# Altium footprint library Molex FFC - FPC Connectors (SMT).PcbLib: 638 footprints (part 14 of 40)
Each footprint in its own frame and in the unit in brackets; x right, y up, seen from the top. Pads: shape width x height; smd on the part's side, far side on the other; paste and mask are expansions set on the pad; w line width, h text height; cw(c..) or ccw(c..) is an arc to the next point about the centre after c.
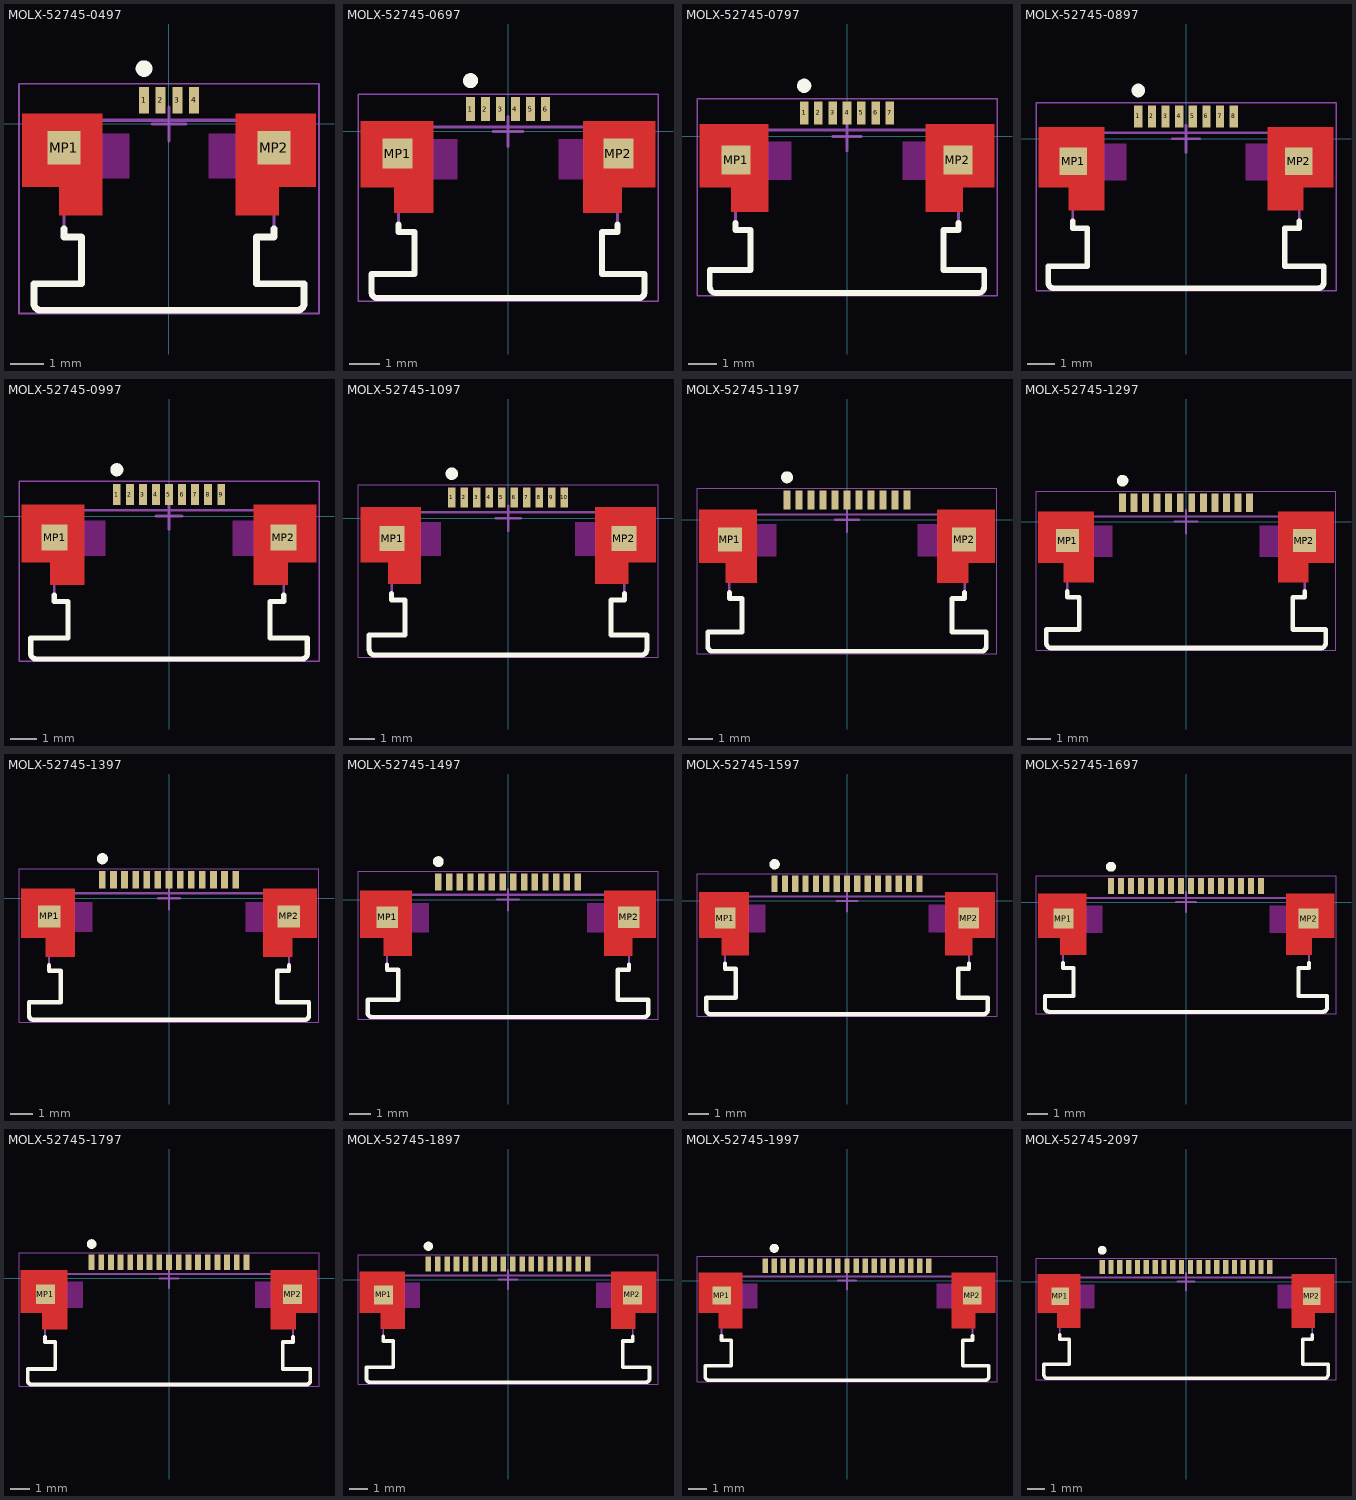
[diagram p13: the footprints below, top view; thin cyan lines are the x and y axes]

## MOLX-52745-0497 [mm] "FPC Connector, 4-Leads, Right Angle, Pitch 0.5 mm, Mated Height 2.0 mm, SMT"
height 2.012
pads (6):
  rect 0.3x0.8 smd: 1(-0.75,0.712) 2(-0.25,0.712) 3(0.25,0.712) 4(0.75,0.712)
  rect 1x1 smd: MP1(-3.15,-0.712) MP2(3.15,-0.712)
Top Layer:
  region: -4.4,0.312 -2,0.312 -2,-2.738 -3.3,-2.738 -3.3,-1.888 -4.4,-1.888
  region: 2,0.312 4.4,0.312 4.4,-1.888 3.3,-1.888 3.3,-2.738 2,-2.738
Top Overlay:
  circle w0.25: c-0.75,1.662 r0.125
  lines w0.2: -3.15,-3.138 -3.15,-3.388 -2.625,-3.388 -2.625,-4.788 -4.05,-4.788 -4.05,-5.388 ccw(c-3.85,-5.388) -3.85,-5.588 3.85,-5.588 ccw(c3.85,-5.388) 4.05,-5.388 4.05,-4.788 2.625,-4.788 2.625,-3.388 3.15,-3.388 3.15,-3.138
Keep-Out Layer:
  region: -2,-0.288 -1.2,-0.288 -1.2,-1.628 -2,-1.628
  region: 2,-0.288 1.2,-0.288 1.2,-1.628 2,-1.628
Mechanical 13:
  lines w0.1: -4.05,-4.79 -4.05,-5.388 ccw(c-3.85,-5.388) -3.85,-5.588 3.85,-5.588 ccw(c3.85,-5.388) 4.05,-5.388 4.05,-4.788 2.625,-4.788 2.625,-3.388 3.15,-3.388 3.15,0.112 -3.15,0.112 -3.15,-3.388 -2.625,-3.388 -2.625,-4.788 -4.049,-4.788 -4.049,-4.789
Mechanical 15:
  lines w0.05: -4.5,-5.688 4.5,-5.688 4.5,1.212 -4.5,1.212 -4.5,-5.688
  lines w0.1: -0.5,0 0.5,0 ; 0,-0.5 0,0.5
3D body: height 0.25, standoff 0, extent -4.05,-5.588 4.051,0.812

## MOLX-52745-0697 [mm] "FPC Connector, 6-Leads, Right Angle, Pitch 0.5 mm, Mated Height 2.0 mm, SMT"
height 2.012
pads (8):
  rect 0.3x0.8 smd: 1(-1.25,0.743) 2(-0.75,0.743) 3(-0.25,0.743) 4(0.25,0.743) 5(0.75,0.743) 6(1.25,0.743)
  rect 1x1 smd: MP1(-3.683,-0.743) MP2(3.683,-0.743)
Top Layer:
  region: -2.5,0.343 -4.9,0.343 -4.9,-1.857 -3.8,-1.857 -3.8,-2.707 -2.5,-2.707
  region: 2.5,0.343 4.9,0.343 4.9,-1.857 3.8,-1.857 3.8,-2.707 2.5,-2.707
Top Overlay:
  circle w0.25: c-1.25,1.693 r0.125
  lines w0.2: -3.65,-3.107 -3.65,-3.357 -3.125,-3.357 -3.125,-4.757 -4.55,-4.757 -4.55,-5.357 ccw(c-4.35,-5.357) -4.35,-5.557 4.35,-5.557 ccw(c4.35,-5.357) 4.55,-5.357 4.55,-4.757 3.125,-4.757 3.125,-3.357 3.65,-3.357 3.65,-3.107
Keep-Out Layer:
  region: -1.7,-0.257 -2.5,-0.257 -2.5,-1.597 -1.7,-1.597
  region: 1.7,-0.257 2.5,-0.257 2.5,-1.597 1.7,-1.597
Mechanical 13:
  lines w0.1: -4.55,-4.759 -4.55,-5.357 ccw(c-4.35,-5.357) -4.35,-5.557 4.35,-5.557 ccw(c4.35,-5.357) 4.55,-5.357 4.55,-4.757 3.125,-4.757 3.125,-3.357 3.65,-3.357 ; -4.549,-4.758 -4.549,-4.757 -3.125,-4.757 -3.125,-3.357 -3.65,-3.357 -3.65,0.143 3.65,0.143 3.65,-3.337
Mechanical 15:
  lines w0.05: -5,-5.657 5,-5.657 5,1.243 -5,1.243 -5,-5.657
  lines w0.1: -0.5,0 0.5,0 ; 0,-0.5 0,0.5
3D body: height 0.25, standoff 0, extent -4.55,-5.557 4.55,0.843

## MOLX-52745-0797 [mm] "FPC Connector, 7-Leads, Right Angle, Pitch 0.5 mm, Mated Height 2.0 mm, SMT"
height 2.012
pads (9):
  rect 0.3x0.8 smd: 1(-1.5,0.824) 2(-1,0.824) 3(-0.5,0.824) 4(0,0.824) 5(0.5,0.824) 6(1,0.824) 7(1.5,0.824)
  rect 1x1 smd: MP1(-3.885,-0.824) MP2(3.885,-0.824)
Top Layer:
  region: 2.75,0.424 5.15,0.424 5.15,-1.776 5.15,-1.777 4.05,-1.777 4.05,-2.626 2.75,-2.626
  region: -5.15,0.424 -2.75,0.424 -2.75,-2.626 -4.05,-2.626 -4.05,-1.777 -4.05,-1.776 -5.15,-1.776
Top Overlay:
  circle w0.25: c-1.5,1.774 r0.125
  lines w0.2: -3.9,-3.026 -3.9,-3.276 -3.375,-3.276 -3.375,-4.676 -4.8,-4.676 -4.8,-5.276 ccw(c-4.6,-5.276) -4.6,-5.476 4.6,-5.476 ccw(c4.6,-5.276) 4.8,-5.276 4.8,-4.676 3.375,-4.676 3.375,-3.276 3.9,-3.276 3.9,-3.026
Keep-Out Layer:
  region: -2.75,-0.176 -1.95,-0.176 -1.95,-1.516 -2.75,-1.516
  region: 2.75,-0.176 1.95,-0.176 1.95,-1.516 2.75,-1.516
Mechanical 13:
  lines w0.1: -4.8,-4.678 -4.8,-5.276 ccw(c-4.6,-5.276) -4.6,-5.476 4.6,-5.476 ccw(c4.6,-5.276) 4.8,-5.276 4.8,-4.676 3.375,-4.676 3.375,-3.276 3.9,-3.276 3.9,0.224 -3.9,0.224 -3.9,-3.276 -3.375,-3.276 -3.375,-4.676 -4.8,-4.676 -4.799,-4.677
Mechanical 15:
  lines w0.05: -5.25,-5.576 -5.25,1.324 5.25,1.324 5.25,-5.576 -5.25,-5.576
  lines w0.1: -0.5,0 0.5,0 ; 0,-0.5 0,0.5
3D body: height 0.25, standoff 0, extent -4.8,-5.476 4.8,0.924

## MOLX-52745-0897 [mm] "FPC Connector, 8-Leads, Right Angle, Pitch 0.5 mm, Mated Height 2.0 mm, SMT"
height 2.012
pads (10):
  rect 0.3x0.8 smd: 1(-1.75,0.824) 2(-1.25,0.824) 3(-0.75,0.824) 4(-0.25,0.824) 5(0.25,0.824) 6(0.75,0.824) 7(1.25,0.824) 8(1.75,0.824)
  rect 1x1 smd: MP1(-4.135,-0.824) MP2(4.135,-0.824)
Top Layer:
  region: 3,0.424 5.4,0.424 5.4,-1.776 5.4,-1.777 4.3,-1.777 4.3,-2.626 3,-2.626
  region: -5.4,0.424 -3,0.424 -3,-2.626 -4.3,-2.626 -4.3,-1.777 -4.3,-1.776 -5.4,-1.776
Top Overlay:
  circle w0.25: c-1.75,1.774 r0.125
  lines w0.2: -4.15,-3.026 -4.15,-3.276 -3.625,-3.276 -3.625,-4.676 -5.05,-4.676 -5.05,-5.276 ccw(c-4.85,-5.276) -4.85,-5.476 4.85,-5.476 ccw(c4.85,-5.276) 5.05,-5.276 5.05,-4.676 3.625,-4.676 3.625,-3.276 4.15,-3.276 4.15,-3.026
Keep-Out Layer:
  region: -3,-0.176 -2.2,-0.176 -2.2,-1.516 -3,-1.516
  region: 3,-0.176 2.2,-0.176 2.2,-1.516 3,-1.516
Mechanical 13:
  lines w0.1: -5.05,-5.276 ccw(c-4.85,-5.276) -4.85,-5.476 4.85,-5.476 ccw(c4.85,-5.276) 5.05,-5.276 5.05,-4.676 3.625,-4.676 3.625,-3.276 4.15,-3.276 4.15,0.224 -4.15,0.224 -4.15,-3.276 -3.625,-3.276 -3.625,-4.676 -5.05,-4.676 -5.049,-4.677 -5.05,-5.276
Mechanical 15:
  lines w0.05: -5.5,-5.576 -5.5,1.324 5.5,1.324 5.5,-5.576 -5.5,-5.576
  lines w0.1: -0.5,0 0.5,0 ; 0,-0.5 0,0.5
3D body: height 0.25, standoff 0, extent -5.05,-5.476 5.05,0.924

## MOLX-52745-0997 [mm] "FPC Connector, 9-Leads, Right Angle, Pitch 0.5 mm, Mated Height 2.0 mm, SMT"
height 2.012
pads (11):
  rect 0.3x0.8 smd: 1(-2,0.823) 2(-1.5,0.824) 3(-1,0.823) 4(-0.5,0.823) 5(0,0.823) 6(0.5,0.823) 7(1,0.823) 8(1.5,0.824) 9(2,0.823)
  rect 1x1 smd: MP1(-4.385,-0.824) MP2(4.385,-0.824)
Top Layer:
  region: 3.25,0.423 3.25,-2.627 4.55,-2.627 4.55,-1.777 5.65,-1.777 5.65,0.423
  region: -5.65,0.423 -3.25,0.423 -3.25,-2.627 -4.55,-2.627 -4.55,-1.777 -5.65,-1.777
Top Overlay:
  circle w0.25: c-2,1.774 r0.125
  lines w0.2: -4.4,-3.026 -4.4,-3.277 -3.875,-3.277 -3.875,-4.677 -5.3,-4.677 -5.3,-5.277 ccw(c-5.1,-5.277) -5.1,-5.476 5.1,-5.476 ccw(c5.1,-5.277) 5.3,-5.277 5.3,-4.676 3.875,-4.676 3.875,-3.277 4.4,-3.277 4.4,-3.026
Keep-Out Layer:
  region: 3.25,-0.177 2.45,-0.177 2.45,-1.517 3.25,-1.517
  region: -3.25,-0.177 -2.45,-0.177 -2.45,-1.517 -3.25,-1.517
Mechanical 13:
  lines w0.1: -5.3,-4.678 -5.3,-5.277 ccw(c-5.1,-5.277) -5.1,-5.477 5.1,-5.476 ccw(c5.1,-5.277) 5.3,-5.277 5.3,-4.677 3.875,-4.677 3.875,-3.277 4.4,-3.277 4.4,0.223 -4.4,0.223 -4.4,-3.277 -3.875,-3.277 -3.875,-4.677 -5.3,-4.677 -5.299,-4.677
Mechanical 15:
  lines w0.05: -5.75,-5.576 -5.75,1.324 5.75,1.324 5.75,-5.576 -5.75,-5.576
  lines w0.1: -0.5,0 0.5,0 ; 0,-0.5 0,0.5
3D body: height 0.25, standoff 0, extent -5.3,-5.476 5.3,0.924

## MOLX-52745-1097 [mm] "FPC Connector, 10-Leads, Right Angle, Pitch 0.5 mm, Mated Height 2.0 mm, SMT"
height 2.012
pads (12):
  rect 0.3x0.8 smd: 1(-2.25,0.824) 2(-1.75,0.824) 3(-1.25,0.824) 4(-0.75,0.824) 5(-0.25,0.824) 6(0.25,0.824) 7(0.75,0.824) 8(1.25,0.824) 9(1.75,0.824) 10(2.25,0.824)
  rect 1x1 smd: MP1(-4.634,-0.824) MP2(4.635,-0.824)
Top Layer:
  region: 3.5,0.424 3.5,-2.626 4.8,-2.626 4.8,-1.777 5.9,-1.777 5.9,-1.776 5.9,0.424
  region: -5.9,0.424 -3.5,0.424 -3.5,-2.626 -4.8,-2.626 -4.8,-1.777 -4.8,-1.776 -5.9,-1.776
Top Overlay:
  circle w0.25: c-2.25,1.774 r0.125
  lines w0.2: -4.65,-3.026 -4.65,-3.276 -4.125,-3.276 -4.125,-4.676 -5.55,-4.676 -5.55,-5.276 ccw(c-5.35,-5.276) -5.35,-5.476 5.35,-5.476 ccw(c5.35,-5.276) 5.55,-5.276 5.55,-4.676 4.125,-4.676 4.125,-3.276 4.65,-3.276 4.65,-3.026
Keep-Out Layer:
  region: 3.5,-0.176 2.7,-0.176 2.7,-1.516 3.5,-1.516
  region: -3.5,-0.176 -2.7,-0.176 -2.7,-1.516 -3.5,-1.516
Mechanical 13:
  lines w0.1: -5.55,-5.276 ccw(c-5.35,-5.276) -5.35,-5.476 5.35,-5.476 ccw(c5.35,-5.276) 5.55,-5.276 5.55,-4.676 4.125,-4.676 4.125,-3.276 4.65,-3.276 4.65,0.224 -4.65,0.224 -4.65,-3.276 -4.125,-3.276 -4.125,-4.676 -5.55,-4.676 -5.549,-4.677 -5.55,-5.276
Mechanical 15:
  lines w0.05: -6,-5.576 -6,1.324 6,1.324 6,-5.576 -6,-5.576
  lines w0.1: -0.5,0 0.5,0 ; 0,-0.5 0,0.5
3D body: height 0.25, standoff 0, extent -5.55,-5.476 5.55,0.924

## MOLX-52745-1197 [mm] "FPC Connector, 11-Leads, Right Angle, Pitch 0.5 mm, Mated Height 2.0 mm, SMT"
height 2.012
pads (13):
  rect 0.3x0.8 smd: 1(-2.5,0.824) 2(-2,0.824) 3(-1.5,0.824) 4(-1,0.824) 5(-0.5,0.824) 6(0,0.824) 7(0.5,0.824) 8(1,0.824) 9(1.5,0.824) 10(2,0.824) 11(2.5,0.824)
  rect 1x1 smd: MP1(-4.885,-0.824) MP2(4.885,-0.824)
Top Layer:
  region: -6.15,0.424 -3.75,0.424 -3.75,-2.626 -5.05,-2.626 -5.05,-1.777 -5.05,-1.776 -6.15,-1.776
  region: 3.75,0.424 3.75,-2.626 5.05,-2.626 5.05,-1.777 6.15,-1.777 6.15,-1.776 6.15,0.424
Top Overlay:
  circle w0.25: c-2.5,1.774 r0.125
  lines w0.2: -4.9,-3.026 -4.9,-3.276 -4.375,-3.276 -4.375,-4.676 -5.8,-4.676 -5.8,-5.276 ccw(c-5.6,-5.276) -5.6,-5.476 5.6,-5.476 ccw(c5.6,-5.276) 5.8,-5.276 5.8,-4.676 4.375,-4.676 4.375,-3.276 4.9,-3.276 4.9,-3.026
Keep-Out Layer:
  region: 3.75,-0.176 2.95,-0.176 2.95,-1.516 3.75,-1.516
  region: -3.75,-0.176 -2.95,-0.176 -2.95,-1.516 -3.75,-1.516
Mechanical 13:
  lines w0.1: -5.8,-4.678 -5.8,-5.276 ccw(c-5.6,-5.276) -5.6,-5.476 5.6,-5.476 ccw(c5.6,-5.276) 5.8,-5.276 5.8,-4.676 4.375,-4.676 4.375,-3.276 4.9,-3.276 4.9,0.224 -4.9,0.224 -4.9,-3.276 -4.375,-3.276 -4.375,-4.676 -5.8,-4.676 -5.799,-4.677
Mechanical 15:
  lines w0.05: -6.25,-5.576 -6.25,1.324 6.25,1.324 6.25,-5.576 -6.25,-5.576
  lines w0.1: -0.5,0 0.5,0 ; 0,-0.5 0,0.5
3D body: height 0.25, standoff 0, extent -5.8,-5.476 5.8,0.924

## MOLX-52745-1297 [mm] "FPC Connector, 12-Leads, Right Angle, Pitch 0.5 mm, Mated Height 2.0 mm, SMT"
height 2.012
pads (14):
  rect 0.3x0.8 smd: 1(-2.75,0.824) 2(-2.25,0.824) 3(-1.75,0.824) 4(-1.25,0.824) 5(-0.75,0.824) 6(-0.25,0.824) 7(0.25,0.824) 8(0.75,0.824) 9(1.25,0.824) 10(1.75,0.824) 11(2.25,0.824) 12(2.75,0.824)
  rect 1x1 smd: MP1(-5.135,-0.824) MP2(5.135,-0.824)
Top Layer:
  region: -6.4,0.424 -4,0.424 -4,-2.626 -5.3,-2.626 -5.3,-1.777 -5.3,-1.776 -6.4,-1.776
  region: 4,0.424 6.4,0.424 6.4,-1.776 6.4,-1.777 5.3,-1.777 5.3,-2.626 4,-2.626
Top Overlay:
  circle w0.25: c-2.75,1.774 r0.125
  lines w0.2: -5.15,-3.026 -5.15,-3.276 -4.625,-3.276 -4.625,-4.676 -6.05,-4.676 -6.05,-5.276 ccw(c-5.85,-5.276) -5.85,-5.476 5.85,-5.476 ccw(c5.85,-5.276) 6.05,-5.276 6.05,-4.676 4.625,-4.676 4.625,-3.276 5.15,-3.276 5.15,-3.026
Keep-Out Layer:
  region: 4,-0.176 3.2,-0.176 3.2,-1.516 4,-1.516
  region: -4,-0.176 -3.2,-0.176 -3.2,-1.516 -4,-1.516
Mechanical 13:
  lines w0.1: -6.05,-4.678 -6.05,-5.276 ccw(c-5.85,-5.276) -5.85,-5.476 5.85,-5.476 ccw(c5.85,-5.276) 6.05,-5.276 6.05,-4.676 4.625,-4.676 4.625,-3.276 5.15,-3.276 5.15,0.224 -5.15,0.224 -5.15,-3.276 -4.625,-3.276 -4.625,-4.676 -6.05,-4.676 -6.049,-4.677
Mechanical 15:
  lines w0.05: -6.5,-5.576 -6.5,1.324 6.5,1.324 6.5,-5.576 -6.5,-5.576
  lines w0.1: -0.5,0 0.5,0 ; 0,-0.5 0,0.5
3D body: height 0.25, standoff 0, extent -6.05,-5.476 6.05,0.924

## MOLX-52745-1397 [mm] "FPC Connector, 13-Leads, Right Angle, Pitch 0.5 mm, Mated Height 2.0 mm, SMT"
height 2.012
pads (15):
  rect 0.3x0.8 smd: 1(-3,0.824) 2(-2.5,0.824) 3(-2,0.824) 4(-1.5,0.824) 5(-1,0.824) 6(-0.5,0.824) 7(0,0.824) 8(0.5,0.824) 9(1,0.824) 10(1.5,0.824) 11(2,0.824) 12(2.5,0.824) 13(3,0.824)
  rect 1x1 smd: MP1(-5.385,-0.824) MP2(5.385,-0.824)
Top Layer:
  region: -6.65,0.424 -4.25,0.424 -4.25,-2.626 -5.55,-2.626 -5.55,-1.777 -5.55,-1.776 -6.65,-1.776
  region: 4.25,0.424 4.25,-2.626 5.55,-2.626 5.55,-1.777 6.65,-1.777 6.65,-1.776 6.65,0.424
Top Overlay:
  circle w0.25: c-3,1.774 r0.125
  lines w0.2: -5.4,-3.026 -5.4,-3.276 -4.875,-3.276 -4.875,-4.676 -6.3,-4.676 -6.3,-5.276 ccw(c-6.1,-5.276) -6.1,-5.476 6.1,-5.476 ccw(c6.1,-5.276) 6.3,-5.276 6.3,-4.676 4.875,-4.676 4.875,-3.276 5.4,-3.276 5.4,-3.026
Keep-Out Layer:
  region: -4.25,-0.176 -3.45,-0.176 -3.45,-1.516 -4.25,-1.516
  region: 4.25,-0.176 3.45,-0.176 3.45,-1.516 4.25,-1.516
Mechanical 13:
  lines w0.1: -6.3,-4.678 -6.3,-5.276 ccw(c-6.1,-5.276) -6.1,-5.476 6.1,-5.476 ccw(c6.1,-5.276) 6.3,-5.276 6.3,-4.676 4.875,-4.676 4.875,-3.276 5.4,-3.276 5.4,0.224 -5.4,0.224 -5.4,-3.276 -4.875,-3.276 -4.875,-4.676 -6.3,-4.676 -6.299,-4.677
Mechanical 15:
  lines w0.05: -6.75,-5.576 -6.75,1.324 6.75,1.324 6.75,-5.576 -6.75,-5.576
  lines w0.1: -0.5,0 0.5,0 ; 0,-0.5 0,0.5
3D body: height 0.25, standoff 0, extent -6.3,-5.476 6.3,0.924

## MOLX-52745-1497 [mm] "FPC Connector, 14-Leads, Right Angle, Pitch 0.5 mm, Mated Height 2.0 mm, SMT"
height 2.012
pads (16):
  rect 0.3x0.8 smd: 1(-3.25,0.824) 2(-2.75,0.824) 3(-2.25,0.824) 4(-1.75,0.824) 5(-1.25,0.824) 6(-0.75,0.824) 7(-0.25,0.824) 8(0.25,0.824) 9(0.75,0.824) 10(1.25,0.824) 11(1.75,0.824) 12(2.25,0.824) 13(2.75,0.824) 14(3.25,0.824)
  rect 1x1 smd: MP1(-5.634,-0.824) MP2(5.635,-0.824)
Top Layer:
  region: -6.9,0.424 -4.5,0.424 -4.5,-2.626 -5.8,-2.626 -5.8,-1.777 -5.8,-1.776 -6.9,-1.776
  region: 4.5,0.424 4.5,-2.626 5.8,-2.626 5.8,-1.777 6.9,-1.777 6.9,-1.776 6.9,0.424
Top Overlay:
  circle w0.25: c-3.25,1.774 r0.125
  lines w0.2: -5.65,-3.026 -5.65,-3.276 -5.125,-3.276 -5.125,-4.676 -6.55,-4.676 -6.55,-5.276 ccw(c-6.35,-5.276) -6.35,-5.476 6.35,-5.476 ccw(c6.35,-5.276) 6.55,-5.276 6.55,-4.676 5.125,-4.676 5.125,-3.276 5.65,-3.276 5.65,-3.026
Keep-Out Layer:
  region: -4.5,-0.176 -3.7,-0.176 -3.7,-1.516 -4.5,-1.516
  region: 4.5,-0.176 3.7,-0.176 3.7,-1.516 4.5,-1.516
Mechanical 13:
  lines w0.1: -6.55,-5.276 ccw(c-6.35,-5.276) -6.35,-5.476 6.35,-5.476 ccw(c6.35,-5.276) 6.55,-5.276 6.55,-4.676 5.125,-4.676 5.125,-3.276 5.65,-3.276 5.65,0.224 -5.65,0.224 -5.65,-3.276 -5.125,-3.276 -5.125,-4.676 -6.55,-4.676 -6.549,-4.677 -6.55,-5.276
Mechanical 15:
  lines w0.05: -7,-5.576 -7,1.324 7,1.324 7,-5.576 -7,-5.576
  lines w0.1: -0.5,0 0.5,0 ; 0,-0.5 0,0.5
3D body: height 0.25, standoff 0, extent -6.55,-5.476 6.55,0.924

## MOLX-52745-1597 [mm] "FPC Connector, 15-Leads, Right Angle, Pitch 0.5 mm, Mated Height 2.0 mm, SMT"
height 2.012
pads (17):
  rect 0.3x0.8 smd: 1(-3.5,0.824) 2(-3,0.824) 3(-2.5,0.824) 4(-2,0.824) 5(-1.5,0.824) 6(-1,0.824) 7(-0.5,0.824) 8(0,0.824) 9(0.5,0.824) 10(1,0.824) 11(1.5,0.824) 12(2,0.824) 13(2.5,0.824) 14(3,0.824) 15(3.5,0.824)
  rect 1x1 smd: MP1(-5.884,-0.824) MP2(5.884,-0.824)
Top Layer:
  region: 4.75,0.424 4.75,-2.626 6.05,-2.626 6.05,-1.777 6.05,-1.776 7.15,-1.776 7.15,0.424
  region: -7.15,0.424 -4.75,0.424 -4.75,-2.626 -6.05,-2.626 -6.05,-1.777 -7.15,-1.777 -7.15,-1.776
Top Overlay:
  circle w0.25: c-3.5,1.774 r0.125
  lines w0.2: -5.9,-3.026 -5.9,-3.276 -5.375,-3.276 -5.375,-4.676 -6.8,-4.676 -6.8,-5.276 ccw(c-6.6,-5.276) -6.6,-5.476 6.6,-5.476 ccw(c6.6,-5.276) 6.8,-5.276 6.8,-4.676 5.375,-4.676 5.375,-3.276 5.9,-3.276 5.9,-3.026
Keep-Out Layer:
  region: -4.75,-0.176 -3.95,-0.176 -3.95,-1.516 -4.75,-1.516
  region: 4.75,-0.176 3.95,-0.176 3.95,-1.516 4.75,-1.516
Mechanical 13:
  lines w0.1: -6.8,-5.276 ccw(c-6.6,-5.276) -6.6,-5.476 6.6,-5.476 ccw(c6.6,-5.276) 6.8,-5.276 6.8,-4.676 5.375,-4.676 5.375,-3.276 5.9,-3.276 5.9,0.224 -5.9,0.224 -5.9,-3.276 -5.375,-3.276 -5.375,-4.676 -6.8,-4.676 -6.799,-4.677 -6.8,-5.276
Mechanical 15:
  lines w0.05: -7.25,-5.576 7.25,-5.576 7.25,1.324 -7.25,1.324 -7.25,-5.576
  lines w0.1: -0.5,0 0.5,0 ; 0,-0.5 0,0.5
3D body: height 0.25, standoff 0, extent -6.8,-5.476 6.8,0.924

## MOLX-52745-1697 [mm] "FPC Connector, 16-Leads, Right Angle, Pitch 0.5 mm, Mated Height 2.0 mm, SMT"
height 2.012
pads (18):
  rect 0.3x0.8 smd: 1(-3.75,0.824) 2(-3.25,0.824) 3(-2.75,0.824) 4(-2.25,0.824) 5(-1.75,0.824) 6(-1.25,0.824) 7(-0.75,0.824) 8(-0.25,0.824) 9(0.25,0.824) 10(0.75,0.824) 11(1.25,0.824) 12(1.75,0.824) 13(2.25,0.824) 14(2.75,0.824) 15(3.25,0.824) 16(3.75,0.824)
  rect 1x1 smd: MP1(-6.134,-0.824) MP2(6.134,-0.824)
Top Layer:
  region: 5,0.424 5,-2.626 6.3,-2.626 6.3,-1.777 6.3,-1.776 7.4,-1.776 7.4,0.424
  region: -7.4,0.424 -5,0.424 -5,-2.626 -6.3,-2.626 -6.3,-1.776 -7.4,-1.776
Top Overlay:
  circle w0.25: c-3.75,1.774 r0.125
  lines w0.2: -6.15,-3.026 -6.15,-3.276 -5.625,-3.276 -5.625,-4.676 -7.05,-4.676 -7.05,-5.276 ccw(c-6.85,-5.276) -6.85,-5.476 6.85,-5.476 ccw(c6.85,-5.276) 7.05,-5.276 7.05,-4.676 5.625,-4.676 5.625,-3.276 6.15,-3.276 6.15,-3.026
Keep-Out Layer:
  region: -5,-0.176 -4.2,-0.176 -4.2,-1.516 -5,-1.516
  region: 5,-0.176 4.2,-0.176 4.2,-1.516 5,-1.516
Mechanical 13:
  lines w0.1: -7.05,-5.276 ccw(c-6.85,-5.276) -6.85,-5.476 6.85,-5.476 ccw(c6.85,-5.276) 7.05,-5.276 7.05,-4.676 5.625,-4.676 5.625,-3.276 6.15,-3.276 6.15,0.224 -6.15,0.224 -6.15,-3.276 -5.625,-3.276 -5.625,-4.676 -7.05,-4.676 -7.049,-4.677 -7.05,-5.276
Mechanical 15:
  lines w0.05: -7.5,-5.576 7.5,-5.576 7.5,1.324 -7.5,1.324 -7.5,-5.576
  lines w0.1: -0.5,0 0.5,0 ; 0,-0.5 0,0.5
3D body: height 0.25, standoff 0, extent -7.05,-5.461 7.05,0.939

## MOLX-52745-1797 [mm] "FPC Connector, 17-Leads, Right Angle, Pitch 0.5 mm, Mated Height 2.0 mm, SMT"
height 2.012
pads (19):
  rect 0.3x0.8 smd: 1(-4,0.824) 2(-3.5,0.824) 3(-3,0.824) 4(-2.5,0.824) 5(-2,0.824) 6(-1.5,0.824) 7(-1,0.824) 8(-0.5,0.824) 9(0,0.824) 10(0.5,0.824) 11(1,0.824) 12(1.5,0.824) 13(2,0.824) 14(2.5,0.824) 15(3,0.824) 16(3.5,0.824) 17(4,0.824)
  rect 1x1 smd: MP1(-6.384,-0.824) MP2(6.384,-0.824)
Top Layer:
  region: 5.25,0.424 5.25,-2.626 6.55,-2.626 6.55,-1.777 6.55,-1.776 7.65,-1.776 7.65,0.424
  region: -7.65,0.424 -5.25,0.424 -5.25,-2.626 -6.55,-2.626 -6.55,-1.777 -7.65,-1.777 -7.65,-1.776
Top Overlay:
  circle w0.25: c-4,1.774 r0.125
  lines w0.2: -6.4,-3.026 -6.4,-3.276 -5.875,-3.276 -5.875,-4.676 -7.3,-4.676 -7.3,-5.276 ccw(c-7.1,-5.276) -7.1,-5.476 7.1,-5.476 ccw(c7.1,-5.276) 7.3,-5.276 7.3,-4.676 5.875,-4.676 5.875,-3.276 6.4,-3.276 6.4,-3.026
Keep-Out Layer:
  region: -5.25,-0.176 -4.45,-0.176 -4.45,-1.516 -5.25,-1.516
  region: 5.25,-0.176 4.45,-0.176 4.45,-1.516 5.25,-1.516
Mechanical 13:
  lines w0.1: -7.3,-4.678 -7.3,-5.276 ccw(c-7.1,-5.276) -7.1,-5.476 7.1,-5.476 ccw(c7.1,-5.276) 7.3,-5.276 7.3,-4.676 5.875,-4.676 5.875,-3.276 6.4,-3.276 6.4,0.224 -6.4,0.224 -6.4,-3.276 -5.875,-3.276 -5.875,-4.676 -7.3,-4.676 -7.299,-4.677
Mechanical 15:
  lines w0.05: -7.75,-5.576 -7.75,1.324 7.75,1.324 7.75,-5.576 -7.75,-5.576
  lines w0.1: -0.5,0 0.5,0 ; 0,-0.5 0,0.5
3D body: height 0.25, standoff 0, extent -7.3,-5.476 7.3,0.924

## MOLX-52745-1897 [mm] "FPC Connector, 18-Leads, Right Angle, Pitch 0.5 mm, Mated Height 2.0 mm, SMT"
height 2.012
pads (20):
  rect 0.3x0.8 smd: 1(-4.25,0.824) 2(-3.75,0.824) 3(-3.25,0.824) 4(-2.75,0.824) 5(-2.25,0.824) 6(-1.75,0.824) 7(-1.25,0.824) 8(-0.75,0.824) 9(-0.25,0.824) 10(0.25,0.824) 11(0.75,0.824) 12(1.25,0.824) 13(1.75,0.824) 14(2.25,0.824) 15(2.75,0.824) 16(3.25,0.824) 17(3.75,0.824) 18(4.25,0.824)
  rect 1x1 smd: MP1(-6.634,-0.824) MP2(6.635,-0.824)
Top Layer:
  region: 7.9,0.424 5.5,0.424 5.5,-0.476 5.5,-0.5 5.5,-1.25 5.5,-1.216 5.5,-2.626 6.8,-2.626 6.8,-1.777 6.8,-1.776 7.9,-1.776
  region: -7.9,0.424 -5.5,0.424 -5.5,-0.476 -5.5,-0.5 -5.5,-1.25 -5.5,-1.216 -5.5,-2.626 -6.8,-2.626 -6.8,-1.777 -7.9,-1.776
Top Overlay:
  circle w0.25: c-4.25,1.774 r0.125
  lines w0.2: -6.65,-3.026 -6.65,-3.276 -6.125,-3.276 -6.125,-4.676 -7.55,-4.676 -7.55,-5.276 ccw(c-7.35,-5.276) -7.35,-5.476 7.35,-5.476 ccw(c7.35,-5.276) 7.55,-5.276 7.55,-4.676 6.125,-4.676 6.125,-3.276 6.65,-3.276 6.65,-3.026
Keep-Out Layer:
  region: 5.5,-0.176 4.7,-0.176 4.7,-1.516 5.5,-1.516
  region: -5.5,-0.176 -4.7,-0.176 -4.7,-1.516 -5.5,-1.516
Mechanical 13:
  lines w0.1: -7.55,-4.678 -7.55,-5.276 ccw(c-7.35,-5.276) -7.35,-5.476 7.35,-5.476 ccw(c7.35,-5.276) 7.55,-5.276 7.55,-4.676 6.125,-4.676 6.125,-3.276 6.65,-3.276 6.65,0.224 -6.65,0.224 -6.65,-3.276 -6.125,-3.276 -6.125,-4.676 -7.55,-4.676 -7.549,-4.677
Mechanical 15:
  lines w0.05: -8,-5.576 8,-5.576 8,1.324 -8,1.324 -8,-5.576
  lines w0.1: -0.5,0 0.5,0 ; 0,-0.5 0,0.5
3D body: height 0.25, standoff 0, extent -7.55,-5.476 7.55,0.924

## MOLX-52745-1997 [mm] "FPC Connector, 19-Leads, Right Angle, Pitch 0.5 mm, Mated Height 2.0 mm, SMT"
height 2.012
pads (21):
  rect 0.3x0.8 smd: 1(-4.5,0.824) 2(-4,0.824) 3(-3.5,0.824) 4(-3,0.824) 5(-2.5,0.824) 6(-2,0.824) 7(-1.5,0.824) 8(-1,0.824) 9(-0.5,0.824) 10(0,0.824) 11(0.5,0.824) 12(1,0.824) 13(1.5,0.824) 14(2,0.824) 15(2.5,0.824) 16(3,0.824) 17(3.5,0.824) 18(4,0.824) 19(4.5,0.824)
  rect 1x1 smd: MP1(-6.884,-0.824) MP2(6.884,-0.824)
Top Layer:
  region: 5.75,0.424 5.75,-2.626 7.05,-2.626 7.05,-1.777 7.05,-1.776 8.15,-1.776 8.15,0.424
  region: -8.15,0.424 -5.75,0.424 -5.75,-2.626 -7.05,-2.626 -7.05,-1.777 -8.15,-1.777 -8.15,-1.776
Top Overlay:
  circle w0.25: c-4,1.774 r0.125
  lines w0.2: -6.9,-3.026 -6.9,-3.276 -6.375,-3.276 -6.375,-4.676 -7.8,-4.676 -7.8,-5.276 ccw(c-7.6,-5.276) -7.6,-5.476 7.6,-5.476 ccw(c7.6,-5.276) 7.8,-5.276 7.8,-4.676 6.375,-4.676 6.375,-3.276 6.9,-3.276 6.9,-3.026
Keep-Out Layer:
  region: 5.75,-0.176 4.95,-0.176 4.95,-1.516 5.75,-1.516
  region: -5.75,-0.176 -4.95,-0.176 -4.95,-1.516 -5.75,-1.516
Mechanical 13:
  lines w0.1: -7.8,-4.678 -7.8,-5.276 ccw(c-7.6,-5.276) -7.6,-5.476 7.6,-5.476 ccw(c7.6,-5.276) 7.8,-5.276 7.8,-4.676 6.375,-4.676 6.375,-3.276 6.9,-3.276 6.9,0.224 -6.9,0.224 -6.9,-3.276 -6.375,-3.276 -6.375,-4.676 -7.8,-4.676 -7.799,-4.677
Mechanical 15:
  lines w0.05: -8.25,-5.576 -8.25,1.324 8.25,1.324 8.25,-5.576 -8.25,-5.576
  lines w0.1: -0.5,0 0.5,0 ; 0,-0.5 0,0.5
3D body: height 0.25, standoff 0, extent -7.8,-5.476 7.8,0.924

## MOLX-52745-2097 [mm] "FPC Connector, 20-Leads, Right Angle, Pitch 0.5 mm, Mated Height 2.0 mm, SMT"
height 2.012
pads (22):
  rect 0.3x0.8 smd: 1(-4.75,0.824) 2(-4.25,0.824) 3(-3.75,0.824) 4(-3.25,0.824) 5(-2.75,0.824) 6(-2.25,0.824) 7(-1.75,0.824) 8(-1.25,0.824) 9(-0.75,0.824) 10(-0.25,0.824) 11(0.25,0.824) 12(0.75,0.824) 13(1.25,0.824) 14(1.75,0.824) 15(2.25,0.824) 16(2.75,0.824) 17(3.25,0.824) 18(3.75,0.824) 19(4.25,0.824) 20(4.75,0.824)
  rect 1x1 smd: MP1(-7.134,-0.824) MP2(7.134,-0.824)
Top Layer:
  region: 6,0.424 8.4,0.424 8.4,-1.776 8.4,-1.777 7.3,-1.777 7.3,-2.626 6,-2.626
  region: -8.4,0.424 -6,0.424 -6,-2.626 -7.3,-2.626 -7.3,-1.777 -7.3,-1.776 -8.4,-1.776
Top Overlay:
  circle w0.25: c-4.75,1.774 r0.125
  lines w0.2: -7.15,-3.026 -7.15,-3.276 -6.625,-3.276 -6.625,-4.676 -8.05,-4.676 -8.05,-5.276 ccw(c-7.85,-5.276) -7.85,-5.476 7.85,-5.476 ccw(c7.85,-5.276) 8.05,-5.276 8.05,-4.676 6.625,-4.676 6.625,-3.276 7.15,-3.276 7.15,-3.026
Keep-Out Layer:
  region: -6,-0.176 -5.2,-0.176 -5.2,-1.516 -6,-1.516
  region: 6,-0.176 5.2,-0.176 5.2,-1.516 6,-1.516
Mechanical 13:
  lines w0.1: -8.05,-4.678 -8.05,-5.276 ccw(c-7.85,-5.276) -7.85,-5.476 7.85,-5.476 ccw(c7.85,-5.276) 8.05,-5.276 8.05,-4.676 6.625,-4.676 6.625,-3.276 7.15,-3.276 7.15,0.224 -7.15,0.224 -7.15,-3.276 -6.625,-3.276 -6.625,-4.676 -8.05,-4.676 -8.049,-4.677
Mechanical 15:
  lines w0.05: -8.5,-5.576 -8.5,1.324 8.5,1.324 8.5,-5.576 -8.5,-5.576
  lines w0.1: -0.5,0 0.5,0 ; 0,-0.5 0,0.5
3D body: height 0.25, standoff 0, extent -8.05,-5.476 8.05,0.924